# Altium footprint library PcbLib1.PcbLib: 5 footprints
Each footprint in its own frame and in the unit in brackets; x right, y up, seen from the top. Pads: shape width x height; smd on the part's side, far side on the other; paste and mask are expansions set on the pad; w line width, h text height; cw(c..) or ccw(c..) is an arc to the next point about the centre after c.
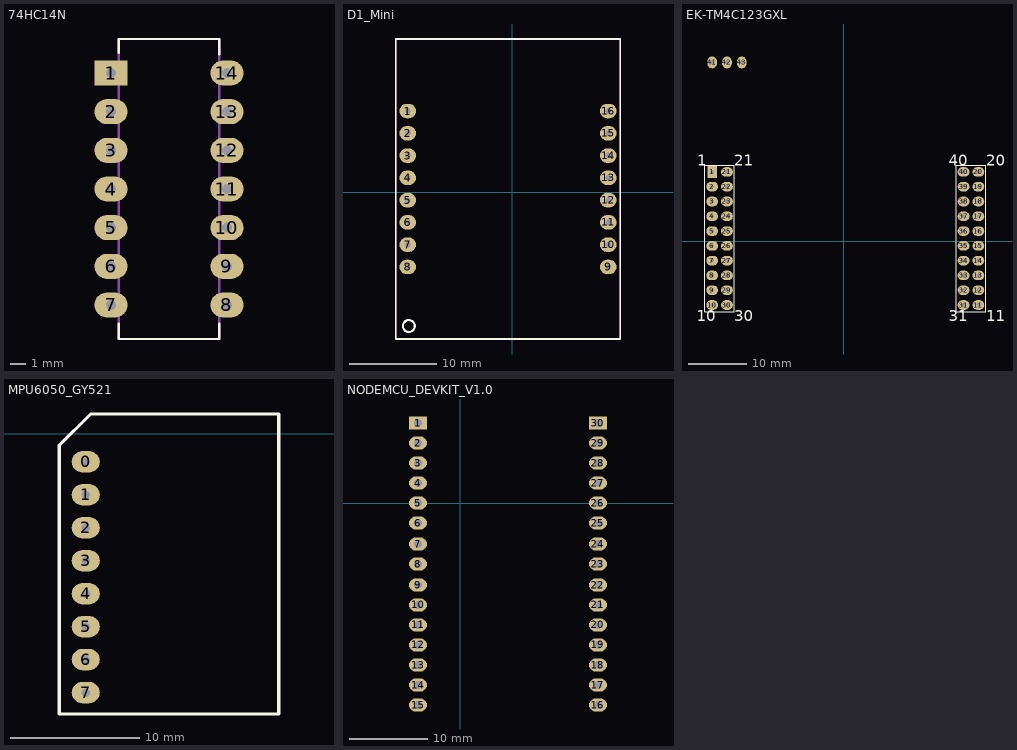
[diagram p0: the footprints below, top view; thin cyan lines are the x and y axes]

## 74HC14N [mil]
pads (14):
  rect 85x65 hole 25.6: 1(280,740)
  oval 85x65 hole 25.6: 2(280,640) 3(280,540) 4(280,440) 5(280,340) 6(280,240) 7(280,140) 8(580,140) 9(580,240) 10(580,340) 11(580,440) 12(580,540) 13(580,640) 14(580,740)
Top Overlay:
  lines w6: 300,92 300,52 560,52 560,92 ; 300,792 300,828 418,828 442,828 560,828 560,788
Mechanical 15:
  lines w6: 258,118 258,162 300,162 300,118 258,118 ; 258,218 258,262 300,262 300,218 258,218 ; 258,318 258,362 300,362 300,318 258,318 ; 258,418 258,462 300,462 300,418 258,418 ; 258,518 258,562 300,562 300,518 258,518 ; 258,618 258,662 300,662 300,618 258,618 ; 258,718 258,762 300,762 300,718 258,718 ; 300,52 560,52 560,828 442,828 418,828 300,828 300,52 ; 560,118 560,162 602,162 602,118 560,118 ; 560,218 560,262 602,262 602,218 560,218 ; 560,318 560,362 602,362 602,318 560,318 ; 560,418 560,462 602,462 602,418 560,418 ; 560,518 560,562 602,562 602,518 560,518 ; 560,618 560,662 602,662 602,618 560,618 ; 560,718 560,762 602,762 602,718 560,718
3D body "SW3DPS-DIP-14-DEFAULT.STEP": height 177.56, standoff -97.24, extent 282.52,70 597.48,820

## D1_Mini [mil]
height 99999
pads (16):
  oval 75x65 hole 25.59: 1(-470,365) 2(-470,265) 3(-470,165) 4(-470,65) 5(-470,-35) 6(-470,-135) 7(-470,-235) 8(-470,-335) 9(430,-335) 10(430,-235) 11(430,-135) 12(430,-35) 13(430,65) 14(430,165) 15(430,265) 16(430,365)
Top Overlay:
  circle w10: c-465,-600 r26.93
  lines w7.87: -523.94,-658.23 483.94,-658.23 483.94,688.23 -523.94,688.23 -523.94,-658.23
Mechanical 15:
  lines w7.87: -523.94,-658.23 -523.94,688.23 483.94,688.23 483.94,-658.23 -523.94,-658.23
3D body "Header_8.STEP": height 335, standoff -82.43, extent 378.27,-388.48 480,408.48
3D body "Header_8.STEP": height 335, standoff -82.43, extent -516.73,-383.48 -415,413.48
3D body "WEMOS_D1_MINI_V3.0.0.step": height 676.15, standoff 221.82, extent -525,-659.21 486.81,689.21

## EK-TM4C123GXL [mil]
pads (43):
  rect 65x80 hole 25.6: 1(-890,470)
  oval 80x65 hole 25.6: 2(-890,370) 3(-890,270) 4(-890,170) 5(-890,70) 6(-890,-30) 7(-890,-130) 8(-890,-230) 9(-890,-330) 10(-890,-430) 11(910,-430) 12(910,-330) 13(910,-230) 14(910,-130) 15(910,-30) 16(910,70) 17(910,170) 18(910,270) 19(910,370) 20(910,470) 21(-790,470) 22(-790,370) 23(-790,270) 24(-790,170) 25(-790,70) 26(-790,-30) 27(-790,-130) 28(-790,-230) 29(-790,-330) 30(-790,-430) 31(810,-430) 32(810,-330) 33(810,-230) 34(810,-130) 35(810,-30) 36(810,70) 37(810,170) 38(810,270) 39(810,370) 40(810,470)
  oval 65x80 hole 25.6: 41(-890,1210) 42(-790,1210) 43(-690,1210)
Top Overlay:
  lines w6: -940,-475 -940,515 -740,515 -740,-475 -940,-475 ; 760,-475 960,-475 960,515 760,515 760,-475
  text "40" at 711.38,511.24 h73.82
  text "31" at 711.4,-540.84 h73.82
  text "30" at -741.08,-540.56 h73.82
  text "21" at -741.08,510.95 h73.82
  text "20" at 962.11,511.38 h73.82
  text "11" at 962.22,-541.01 h73.82
  text "10" at -992.62,-541.15 h73.82
  text "1" at -991.79,511.14 h73.82
3D body "User Library-PinHeaderX3.STEP": height 385.04, standoff -94.88, extent -939.99,1152.52 -639.99,1267.49
3D body "KIT_TIVAC123M.STEP": height 803.94, standoff 110.63, extent -990,-929.68 1010,1709.69
3D body "Pin Header 2x10 TH Pitch 2.54mm.stp": height 373.85, standoff -125.98, extent -940,-480 -740,520
3D body "Pin Header 2x10 TH Pitch 2.54mm.stp": height 373.85, standoff -125.98, extent 760,-480 960,520
3D body "Header_3.STEP": height 582.42, standoff 165.35, extent -940,1160 -640,1260

## MPU6050_GY521 [mil]
pads (8):
  oval 85x65 hole 25.6: 0(-1360,-85) 1(-1360,-185) 2(-1360,-285) 3(-1360,-385) 4(-1360,-485) 5(-1360,-585) 6(-1360,-685) 7(-1360,-785)
Top Overlay:
  lines w10: -1440,-850 -775,-850 -775,60 -1345,60 -1440,-35 -1440,-850
3D body "MPU 6050 IMU.STEP": height 584.36, standoff 144.36, extent -1410,-845.5 -785,-14.5
3D body "Header_8.STEP": height 335, standoff -82.43, extent -1411.73,-829.99 -1309.99,-33.03

## NODEMCU_DEVKIT_V1.0 [mil]
pads (30):
  rect 90x65 hole 42: 1(-210,400) 30(690,400)
  oval 90x65 hole 42: 2(-210,300) 3(-210,200) 4(-210,100) 5(-210,0) 6(-210,-100) 7(-210,-205) 8(-210,-305) 9(-210,-410) 10(-210,-510) 11(-210,-610) 12(-210,-710) 13(-210,-810) 14(-210,-910) 15(-210,-1010) 16(690,-1010) 17(690,-910) 18(690,-810) 19(690,-710) 20(690,-610) 21(690,-510) 22(690,-410) 23(690,-305) 24(690,-205) 25(690,-100) 26(690,0) 27(690,100) 28(690,200) 29(690,300)
3D body "Header_15.STEP": height 335.4, standoff -83.91, extent 639.13,-1044.94 740,440
3D body "Header_15.STEP": height 335.4, standoff -83.91, extent -258.74,-1043.78 -157.87,441.16
3D body "NODEMCU_DEVKIT_V1.0.step": height 578.8, standoff 98.8, extent -272.48,-1243.87 742.48,685